# Altium footprint library MyComponents_v2.5.PcbLib: 403 footprints (part 4 of 26)
Each footprint in its own frame and in the unit in brackets; x right, y up, seen from the top. Pads: shape width x height; smd on the part's side, far side on the other; paste and mask are expansions set on the pad; w line width, h text height; cw(c..) or ccw(c..) is an arc to the next point about the centre after c.
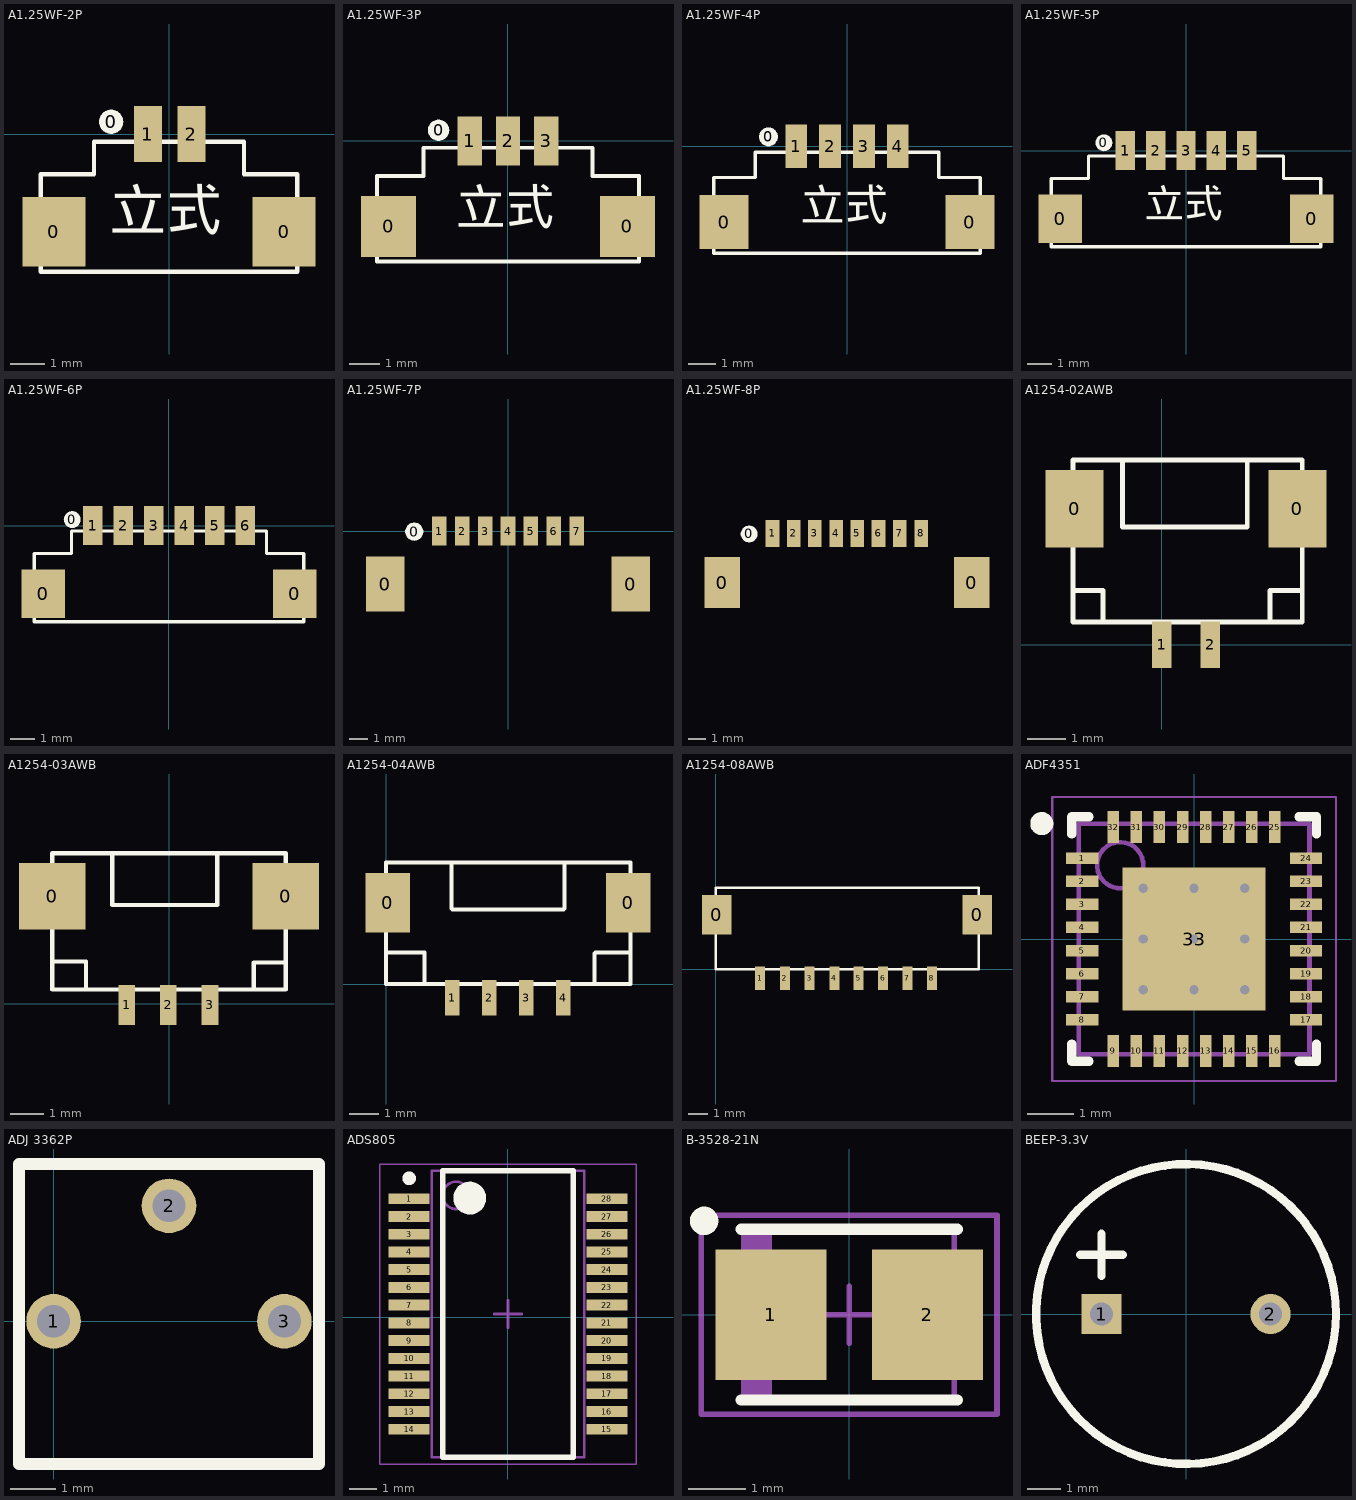
[diagram p3: the footprints below, top view; thin cyan lines are the x and y axes]

## A1.25WF-2P [mm] "1.25mm卧贴 立式"
pads (5):
  rect 1.8x2 smd: 0(-3.3,-2.8) 0(3.3,-2.8)
  round 0.7 on Top Overlay: 0(-1.66,0.35)
  rect 0.8x1.6 smd: 1(-0.605,0) 2(0.645,0)
Top Overlay:
  lines w0.127: -3.675,-3.95 -3.675,-1.15 -2.15,-1.15 -2.15,-0.225 0,-0.225 2.15,-0.225 2.15,-1.15 3.675,-1.15 3.675,-3.95 0,-3.95 -3.675,-3.95
  text "立式" at -1.7,-3.125 h2.03
3D body "MX1.25W-2p.stp": height 4.97, standoff -0.03, extent -3.625,-3.95 3.625,0.255

## A1.25WF-3P [mm] "1.25mm卧贴"
pads (6):
  rect 1.8x2 smd: 0(-3.905,-2.8) 0(3.925,-2.8)
  round 0.7 on Top Overlay: 0(-2.265,0.35)
  rect 0.8x1.6 smd: 1(-1.24,0) 2(0.01,0) 3(1.26,0)
Top Overlay:
  lines w0.127: -0.125,-3.95 4.3,-3.95 4.3,-1.15 2.775,-1.15 2.775,-0.225 0,-0.225 ; 0.02,-0.225 -2.755,-0.225 -2.755,-1.15 -4.28,-1.15 -4.28,-3.95 0.145,-3.95
  text "立式" at -1.69,-3.125 h2.03
3D body "MX1.25W-3P.stp": height 4.97, standoff -0.03, extent -4.25,-3.975 4.25,0.23

## A1.25WF-4P [mm]
pads (7):
  rect 1.8x2 smd: 0(-4.54,-2.8) 0(4.54,-2.8)
  round 0.7 on Top Overlay: 0(-2.9,0.35)
  rect 0.8x1.6 smd: 1(-1.875,0) 2(-0.625,0) 3(0.625,0) 4(1.875,0)
Top Overlay:
  lines w0.127: -4.915,-3.95 -4.915,-1.15 -3.39,-1.15 -3.39,-0.225 0,-0.225 3.39,-0.225 3.39,-1.15 4.915,-1.15 4.915,-3.95 0,-3.95 -4.915,-3.95
  text "立式" at -1.7,-3.125 h2.03
3D body "MX1.25W-4P.stp": height 4.97, standoff -0.03, extent -4.825,-3.95 4.925,0.255

## A1.25WF-5P [mm]
pads (8):
  rect 1.8x2 smd: 0(-5.165,-2.8) 0(5.165,-2.8)
  round 0.7 on Top Overlay: 0(-3.375,0.325)
  rect 0.8x1.6 smd: 1(-2.5,0) 2(-1.25,0) 3(0,0) 4(1.25,0) 5(2.5,0)
Top Overlay:
  lines w0.127: -5.54,-3.95 0.625,-3.95 5.54,-3.95 5.54,-1.15 4.015,-1.15 4.015,-0.225 0.625,-0.225 -4.015,-0.225 -4.015,-1.15 -5.54,-1.15 -5.54,-3.95
  text "立式" at -1.7,-3.125 h2.03
3D body "MX1.25W-5p.stp": height 4.97, standoff -0.03, extent -5.5,-3.975 5.5,0.23

## A1.25WF-6P [mm] "卧贴  1.25mm间距  6P"
pads (9):
  rect 1.8x2 smd: 0(-5.162,-2.8) 0(5.168,-2.8)
  round 0.7 on Top Overlay: 0(-3.975,0.25)
  rect 0.8x1.6 smd: 1(-3.122,0) 2(-1.872,0) 3(-0.622,0) 4(0.628,0) 5(1.878,0) 6(3.128,0)
Top Overlay:
  lines w0.127: -5.537,-3.95 -5.537,-1.15 -4.012,-1.15 -4.012,-0.225 0.628,-0.225 4.018,-0.225 4.018,-1.15 5.543,-1.15 5.543,-3.95 0.628,-3.95 -5.537,-3.95

## A1.25WF-7P [mm]
pads (10):
  rect 2.1x3 smd: 0(-6.703,-2.9) 0(6.703,-2.9)
  round 1 on Top Overlay: 0(-5.128,-0.03)
  rect 0.8x1.6 smd: 1(-3.75,0) 2(-2.5,0) 3(-1.25,0) 4(0,0) 5(1.25,0) 6(2.5,0) 7(3.765,0)
3D body "1.25mm 7P.stp": height 2.5, standoff 0, extent -6.867,-6.169 6.833,0.531

## A1.25WF-8P [mm]
pads (11):
  rect 2.1x3 smd: 0(-1259.163,-1265.465) 0(-1244.473,-1265.465)
  round 1 on Top Overlay: 0(-1257.588,-1262.595)
  rect 0.8x1.6 smd: 1(-1256.21,-1262.565) 2(-1254.96,-1262.565) 3(-1253.71,-1262.565) 4(-1252.46,-1262.565) 5(-1251.21,-1262.565) 6(-1249.96,-1262.565) 7(-1248.695,-1262.565) 8(-1247.445,-1262.565)

## A1254-02AWB [mm] "pitch 1.25mm，额定电流1A，额定电压50V，接触电阻20mOhm"
height 4.25
pads (4):
  rect 1.5x2 smd: 0(-2.254,3.521) 0(3.504,3.521)
  rect 0.5x1.2 smd: 1(0,0) 2(1.25,0)
Top Overlay:
  lines w0.127: -2.286,1.397 -1.524,1.397 -1.524,0.584 ; -1.016,4.775 -1.016,3.048 2.21,3.048 2.21,4.775 ; 2.794,0.584 2.794,1.397 3.632,1.397 ; -2.3,0.584 -2.3,4.775 3.632,4.775 3.632,0.584 -2.3,0.584
3D body "GH1.25AW-2p.STEP": height 4.5, standoff 0.05, extent -2.2,0.025 3.55,4.825

## A1254-03AWB [mm] "1.25mm，额定电流1A，额定电压50V，接触电阻20mOhm"
height 4.25
pads (5):
  rect 2x2 smd: 0(-3.5,3.226) 0(3.5,3.226)
  rect 0.5x1.2 smd: 1(-1.27,-0.025) 2(-0.02,-0.025) 3(1.23,-0.025)
Top Overlay:
  lines w0.127: -3.505,0.45 -3.505,4.521 3.505,4.521 3.505,0.432 -3.5,0.432 ; -3.48,1.27 -2.489,1.27 -2.489,0.457 ; -1.702,4.47 -1.702,2.972 1.448,2.972 1.448,4.496 ; 2.54,0.432 2.54,1.245 3.429,1.245
3D body "GH1.25WF-3P.STEP": height 4.18, standoff -0.03, extent -3.525,-0.325 3.475,4.625

## A1254-04AWB [mm] "1.25mm，额定电流1A，额定电压50V，接触电阻20mOhm"
height 4.25
pads (6):
  rect 1.5x2 smd: 0(0.051,2.743) 0(8.179,2.743)
  rect 0.5x1.2 smd: 1(2.23,-0.457) 2(3.48,-0.457) 3(4.73,-0.457) 4(5.98,-0.457)
Top Overlay:
  lines w0.127: 0,1.067 1.295,1.067 1.295,0.076 ; 2.21,4.064 2.21,2.54 2.235,2.515 5.994,2.515 6.02,2.54 6.02,4.039 ; 7.036,0.025 7.036,1.041 7.061,1.067 8.23,1.067 ; 0,0 0,4.1 8.25,4.1 8.25,0 0,0

## A1254-08AWB [mm]
height 4.25
pads (10):
  rect 1.5x2 smd: 0(0.051,2.743) 0(13.183,2.743)
  rect 0.5x1.2 smd: 1(2.23,-0.457) 2(3.48,-0.457) 3(4.73,-0.457) 4(5.976,-0.457) 5(7.206,-0.457) 6(8.436,-0.457) 7(9.667,-0.457) 8(10.897,-0.457)
Top Overlay:
  lines w0.127: 0,4.1 0,0 13.25,0 13.25,4.1 0.051,4.1

## ADF4351 [mm]
height 1
pads (33):
  rect 0.7x0.25 smd: 1(-2.425,1.75) 2(-2.425,1.25) 3(-2.425,0.75) 4(-2.425,0.25) 5(-2.425,-0.25) 6(-2.425,-0.75) 7(-2.425,-1.25) 8(-2.425,-1.75) 17(2.425,-1.75) 18(2.425,-1.25) 19(2.425,-0.75) 20(2.425,-0.25) 21(2.425,0.25) 22(2.425,0.75) 23(2.425,1.25) 24(2.425,1.75)
  rect 0.25x0.7 smd: 9(-1.75,-2.425) 10(-1.25,-2.425) 11(-0.75,-2.425) 12(-0.25,-2.425) 13(0.25,-2.425) 14(0.75,-2.425) 15(1.25,-2.425) 16(1.75,-2.425) 25(1.75,2.425) 26(1.25,2.425) 27(0.75,2.425) 28(0.25,2.425) 29(-0.25,2.425) 30(-0.75,2.425) 31(-1.25,2.425) 32(-1.75,2.425)
  rect 3.1x3.1 smd: 33(0,0)
via 1.1,-1.1 diameter 0.5 hole 0.2
via 0,-1.1 diameter 0.5 hole 0.2
via -1.1,-1.1 diameter 0.5 hole 0.2
via 1.1,0 diameter 0.5 hole 0.2
via 0,0 diameter 0.5 hole 0.2
via -1.1,0 diameter 0.5 hole 0.2
via 1.1,1.1 diameter 0.5 hole 0.2
via 0,1.1 diameter 0.5 hole 0.2
via -1.1,1.1 diameter 0.5 hole 0.2
Top Overlay:
  circle w0.25: c-3.3,2.5 r0.125
  lines w0.2: -2.65,-2.275 -2.65,-2.65 -2.275,-2.65 ; -2.65,2.275 -2.65,2.65 -2.275,2.65 ; 2.275,-2.65 2.65,-2.65 2.65,-2.275 ; 2.275,2.65 2.65,2.65 2.65,2.275
Mechanical 13:
  circle w0.1: c-1.6,1.6 r0.5
  lines w0.1: -2.5,-2.5 2.5,-2.5 2.5,2.5 -2.5,2.5 -2.5,-2.5
Mechanical 15:
  lines w0.05: -3.075,-3.075 3.075,-3.075 3.075,3.075 -3.075,3.075 -3.075,-3.075
  lines w0.1: -0.5,0 0.5,0 ; 0,-0.5 0,0.5
3D body: height 1, standoff 0.02, extent -2.5,-2.5 2.5,2.5

## ADJ 3362P [mm]
pads (3):
  round 1.2 hole 0.72: 1(0,0) 2(2.54,2.54) 3(5.08,0)
Top Overlay:
  lines w0.254: -0.76,-3.14 -0.76,3.46 5.84,3.46 5.84,-3.14 -0.76,-3.14

## ADS805 [mm]
pads (28):
  rect 1.5x0.4 smd: 1(-3.625,4.352) 2(-3.625,3.702) 3(-3.625,3.052) 4(-3.625,2.402) 5(-3.625,1.752) 6(-3.625,1.102) 7(-3.625,0.452) 8(-3.625,-0.198) 9(-3.625,-0.848) 10(-3.625,-1.498) 11(-3.625,-2.148) 12(-3.625,-2.798) 13(-3.625,-3.448) 14(-3.625,-4.098) 15(3.625,-4.098) 16(3.625,-3.448) 17(3.625,-2.798) 18(3.625,-2.148) 19(3.625,-1.498) 20(3.625,-0.848) 21(3.625,-0.198) 22(3.625,0.452) 23(3.625,1.102) 24(3.625,1.752) 25(3.625,2.402) 26(3.625,3.052) 27(3.625,3.702) 28(3.625,4.352)
Top Overlay:
  circle w0.25: c-3.625,5.102 r0.125
  circle w0.6: c-1.4,4.377 r0.3
  lines w0.2: -2.4,-5.123 -2.4,5.377 2.4,5.377 2.4,-5.123 -2.4,-5.123
Mechanical 13:
  circle w0.1: c-1.9,4.477 r0.5
  lines w0.1: -2.8,-5.123 -2.8,5.377 2.8,5.377 2.8,-5.123 -2.8,-5.123
Mechanical 15:
  lines w0.05: -4.7,-5.373 -4.7,5.627 4.7,5.627 4.7,-5.373 -4.7,-5.373
  lines w0.1: -0.5,0.127 0.5,0.127 ; 0,-0.373 0,0.627
3D body: height 2, standoff 0.05, extent -2.8,-5.123 2.8,5.377

## B-3528-21N [mm] "B型钽电容"
height 2.1
pads (2):
  rect 1.95x2.3 smd: 1(-1.375,0) 2(1.375,0)
Top Overlay:
  circle w0.25: c-2.55,1.65 r0.125
  lines w0.2: -1.9,-1.5 1.9,-1.5 ; -1.9,1.5 1.9,1.5
Mechanical 13:
  rectangle: -1.85,-1.5 -1.352,1.5
  lines w0.1: -1.85,-1.5 -1.85,1.5 1.85,1.5 1.85,-1.5 -1.85,-1.5
Mechanical 15:
  lines w0.1: -0.5,0 0.5,0 ; 0,-0.5 0,0.5 ; -2.6,-1.75 -2.6,1.75 2.6,1.75 2.6,-1.75 -2.6,-1.75
3D body: height 2.1, standoff 0, extent -1.85,-1.5 1.85,1.5

## BEEP-3.3V [mm] "Φ9X5.5mm  3.3V"
height 5.5
pads (2):
  rect 1.2x1.2 hole 0.7: 1(-2.54,0)
  round 1.2 hole 0.7: 2(2.54,0)
Top Overlay:
  circle w0.254: c0,0 r4.51
  lines w0.254: -3.175,1.778 -1.905,1.778 ; -2.54,1.143 -2.54,2.413